# Altium footprint library NXP_60_26022015.PCBLIB: 287 footprints (part 3 of 18)
Each footprint in its own frame and in the unit in brackets; x right, y up, seen from the top. Pads: shape width x height; smd on the part's side, far side on the other; paste and mask are expansions set on the pad; w line width, h text height; cw(c..) or ccw(c..) is an arc to the next point about the centre after c.
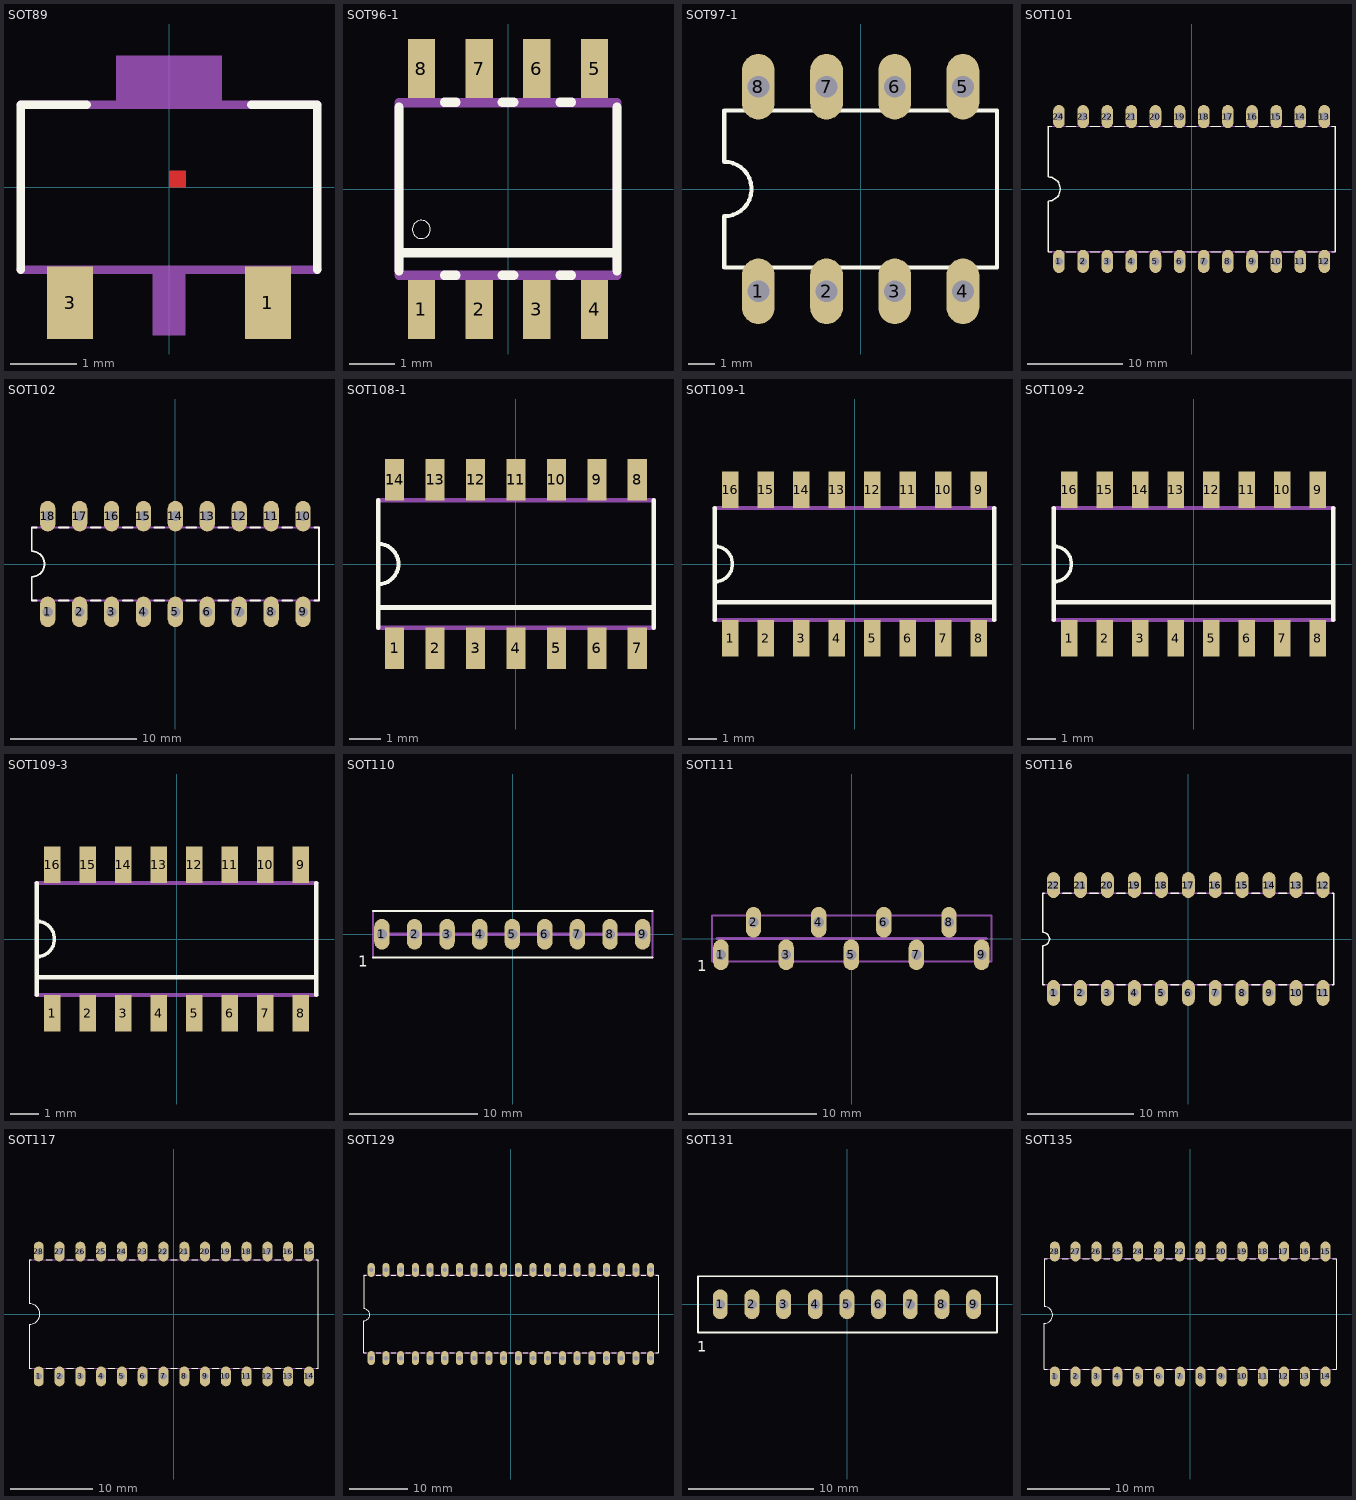
[diagram p2: the footprints below, top view; thin cyan lines are the x and y axes]

## SOT89 [mm]
pads (3):
  rect 0.7x1.1 smd: 1(1.5,-1.75) 3(-1.5,-1.75)
  rect 0x0 smd: 2(0,-2)
Top Layer:
  region: 0,0 0.254,0 0.254,0.254 0,0.254
Top Overlay:
  lines w0.127: -2.25,-1.25 -2.25,1.25 -1.25,1.25 ; 1.25,1.25 2.25,1.25 2.25,-1.25
Top Paste:
  rectangle: -0.3,-2.25 0.3,-1.25
  rectangle: -1.8,-2.25 -1.2,-1.25
  rectangle: 1.2,-2.25 1.8,-1.25
  rectangle: -0.95,1.4 0.95,2.25
  rectangle: -0.6,0 0.6,1.2
Top Solder:
  region: 0,0 0.254,0 0.254,0.254 0,0.254
Mechanical 16:
  rectangle: -0.25,-2.25 0.25,-1.25
  rectangle: -1.75,-2.25 -1.25,-1.25
  rectangle: 1.25,-2.25 1.75,-1.25
  rectangle: -0.8,1.25 0.8,2
  lines w0.127: -2.25,-1.25 2.25,-1.25 ; -2.25,1.25 2.25,1.25

## SOT96-1 [mm]
pads (8):
  rect 0.6x1.3 smd: 1(-1.905,-2.65) 2(-0.635,-2.65) 3(0.635,-2.65) 4(1.905,-2.65) 5(1.905,2.65) 6(0.635,2.65) 7(-0.635,2.65) 8(-1.905,2.65)
Top Overlay:
  circle w0: c-1.905,-0.889 r0.2
  lines w0.203: -2.4,-1.8 -2.4,-1.4 ; -2.4,1.8 -2.4,-1.4 ; -1.397,-1.9 -1.143,-1.9 ; -1.397,1.91 -1.143,1.91 ; -0.127,-1.9 0.127,-1.9 ; -0.127,1.91 0.127,1.91 ; 1.143,-1.9 1.397,-1.9 ; 1.143,1.91 1.397,1.91 ; 2.4,-1.8 2.4,-1.4 ; 2.4,1.8 2.4,-1.4 ; -2.4,-1.4 2.4,-1.4
Mechanical 16:
  rectangle: -2.15,-3.1 -1.66,-2
  rectangle: -0.88,-3.1 -0.39,-2
  rectangle: 0.39,-3.1 0.88,-2
  rectangle: 1.66,-3.1 2.15,-2
  rectangle: 1.66,2 2.15,3.1
  rectangle: 0.39,2 0.88,3.1
  rectangle: -0.88,2 -0.39,3.1
  rectangle: -2.15,2 -1.66,3.1
  lines w0.203: -2.4,-1.9 2.4,-1.9 2.4,-1.4 2.4,1.9 -2.4,1.9 -2.4,-1.4 -2.4,-1.9

## SOT97-1 [mil]
pads (8):
  oval 48x96 hole 32: 1(-150,-150) 2(-50,-150) 3(50,-150) 4(150,-150) 5(150,150) 6(50,150) 7(-50,150) 8(-150,150)
Top Overlay:
  lines w6: -200,-115 200,-115 200,115 -200,115 -200,40 cw(c-200,0) -200,-40 -200,-115

## SOT101 [mil]
pads (24):
  oval 48x96 hole 32: 1(-550,-300) 2(-450,-300) 3(-350,-300) 4(-250,-300) 5(-150,-300) 6(-50,-300) 7(50,-300) 8(150,-300) 9(250,-300) 10(350,-300) 11(450,-300) 12(550,-300) 13(550,300) 14(450,300) 15(350,300) 16(250,300) 17(150,300) 18(50,300) 19(-50,300) 20(-150,300) 21(-250,300) 22(-350,300) 23(-450,300) 24(-550,300)
Top Overlay:
  lines w5: -595,-260 -580,-260 ; -595,260 -580,260 ; -520,-260 -480,-260 ; -520,260 -480,260 ; -420,-260 -380,-260 ; -420,260 -380,260 ; -320,-260 -280,-260 ; -320,260 -280,260 ; -220,-260 -180,-260 ; -220,260 -180,260 ; -120,-260 -80,-260 ; -120,260 -80,260 ; -20,-260 20,-260 ; -20,260 20,260 ; 80,-260 120,-260 ; 80,260 120,260 ; 180,-260 220,-260 ; 180,260 220,260 ; 280,-260 320,-260 ; 280,260 320,260 ; 380,-260 420,-260 ; 380,260 420,260 ; 480,-260 520,-260 ; 480,260 520,260 ; 580,-260 595,-260 ; 580,260 595,260
  lines w6: -595,-260 -595,-50 ccw(c-595,0) -595,50 -595,260 ; 595,-260 595,260
Mechanical 16:
  lines w5: -595,260 595,260
  lines w6: -595,-260 595,-260

## SOT102 [mil]
pads (18):
  oval 48x96 hole 32: 1(-400,-150) 2(-300,-150) 3(-200,-150) 4(-100,-150) 5(0,-150) 6(100,-150) 7(200,-150) 8(300,-150) 9(400,-150) 10(400,150) 11(300,150) 12(200,150) 13(100,150) 14(0,150) 15(-100,150) 16(-200,150) 17(-300,150) 18(-400,150)
Top Overlay:
  lines w6: -435,-115 -450,-115 -450,-40 ccw(c-450,0) -450,40 -450,115 -435,115 ; -365,-115 -335,-115 ; -365,115 -335,115 ; -265,-115 -235,-115 ; -265,115 -235,115 ; -165,-115 -135,-115 ; -165,115 -135,115 ; -65,-115 -35,-115 ; -65,115 -35,115 ; 35,-115 65,-115 ; 35,115 65,115 ; 135,-115 165,-115 ; 135,115 165,115 ; 235,-115 265,-115 ; 235,115 265,115 ; 335,-115 365,-115 ; 335,115 365,115 ; 435,-115 450,-115 450,115 435,115
Mechanical 16:
  lines w6: -450,-115 450,-115 ; -450,115 450,115

## SOT108-1 [mm]
pads (14):
  rect 0.6x1.3 smd: 1(-3.81,-2.65) 2(-2.54,-2.65) 3(-1.27,-2.65) 4(0,-2.65) 5(1.27,-2.65) 6(2.54,-2.65) 7(3.81,-2.65) 8(3.81,2.65) 9(2.54,2.65) 10(1.27,2.65) 11(0,2.65) 12(-1.27,2.65) 13(-2.54,2.65) 14(-3.81,2.65)
Top Overlay:
  lines w0.127: -4.325,-0.635 ccw(c-4.325,0) -4.325,0.635
  lines w0.152: -4.325,-2 -4.325,-1.37 ; -4.325,2 -4.325,0.635 -4.325,-0.635 -4.325,-1.37 ; 4.325,-2 4.325,-1.37 ; 4.325,2 4.325,-1.37 ; -4.325,-1.37 4.325,-1.37
Mechanical 16:
  rectangle: -0.254,2 0.254,3
  rectangle: -1.524,2 -1.016,3
  rectangle: -2.794,2 -2.286,3
  rectangle: -4.064,2 -3.556,3
  rectangle: 1.016,2 1.524,3
  rectangle: 2.286,2 2.794,3
  rectangle: 3.556,2 4.064,3
  rectangle: -0.254,-3 0.254,-2
  rectangle: -1.524,-3 -1.016,-2
  rectangle: -2.794,-3 -2.286,-2
  rectangle: -4.064,-3 -3.556,-2
  rectangle: 1.016,-3 1.524,-2
  rectangle: 2.286,-3 2.794,-2
  rectangle: 3.556,-3 4.064,-2
  lines w0.152: -4.325,-2 4.325,-2 ; -4.325,2 4.325,2

## SOT109-1 [mm]
pads (16):
  rect 0.6x1.3 smd: 1(-4.445,-2.65) 2(-3.175,-2.65) 3(-1.905,-2.65) 4(-0.635,-2.65) 5(0.635,-2.65) 6(1.905,-2.65) 7(3.175,-2.65) 8(4.445,-2.65) 9(4.445,2.65) 10(3.175,2.65) 11(1.905,2.65) 12(0.635,2.65) 13(-0.635,2.65) 14(-1.905,2.65) 15(-3.175,2.65) 16(-4.445,2.65)
Top Overlay:
  lines w0.127: -5,-0.635 ccw(c-5,0) -5,0.635
  lines w0.152: -5,-2 -5,-1.37 ; -5,2 -5,0.635 -5,-0.635 -5,-1.37 ; 5,-2 5,-1.37 ; 5,2 5,-1.37 ; -5,-1.37 5,-1.37
Mechanical 16:
  rectangle: -0.889,2 -0.381,3
  rectangle: -2.159,2 -1.651,3
  rectangle: -3.429,2 -2.921,3
  rectangle: -4.699,2 -4.191,3
  rectangle: 0.381,2 0.889,3
  rectangle: 1.651,2 2.159,3
  rectangle: 2.921,2 3.429,3
  rectangle: 4.191,2 4.699,3
  rectangle: -0.889,-3 -0.381,-2
  rectangle: -2.159,-3 -1.651,-2
  rectangle: -3.429,-3 -2.921,-2
  rectangle: -4.699,-3 -4.191,-2
  rectangle: 0.381,-3 0.889,-2
  rectangle: 1.651,-3 2.159,-2
  rectangle: 2.921,-3 3.429,-2
  rectangle: 4.191,-3 4.699,-2
  lines w0.152: -5,-2 5,-2 ; -5,2 5,2

## SOT109-2 [mm]
pads (16):
  rect 0.6x1.3 smd: 1(-4.445,-2.65) 2(-3.175,-2.65) 3(-1.905,-2.65) 4(-0.635,-2.65) 5(0.635,-2.65) 6(1.905,-2.65) 7(3.175,-2.65) 8(4.445,-2.65) 9(4.445,2.65) 10(3.175,2.65) 11(1.905,2.65) 12(0.635,2.65) 13(-0.635,2.65) 14(-1.905,2.65) 15(-3.175,2.65) 16(-4.445,2.65)
Top Overlay:
  lines w0.127: -5,-0.635 ccw(c-5,0) -5,0.635
  lines w0.152: -5,-2 -5,-1.37 ; -5,2 -5,0.635 -5,-0.635 -5,-1.37 ; 5,-2 5,-1.37 ; 5,2 5,-1.37 ; -5,-1.37 5,-1.37
Mechanical 16:
  rectangle: -0.889,2 -0.381,3
  rectangle: -2.159,2 -1.651,3
  rectangle: -3.429,2 -2.921,3
  rectangle: -4.699,2 -4.191,3
  rectangle: 0.381,2 0.889,3
  rectangle: 1.651,2 2.159,3
  rectangle: 2.921,2 3.429,3
  rectangle: 4.191,2 4.699,3
  rectangle: -0.889,-3 -0.381,-2
  rectangle: -2.159,-3 -1.651,-2
  rectangle: -3.429,-3 -2.921,-2
  rectangle: -4.699,-3 -4.191,-2
  rectangle: 0.381,-3 0.889,-2
  rectangle: 1.651,-3 2.159,-2
  rectangle: 2.921,-3 3.429,-2
  rectangle: 4.191,-3 4.699,-2
  lines w0.152: -5,-2 5,-2 ; -5,2 5,2

## SOT109-3 [mm]
pads (16):
  rect 0.6x1.3 smd: 1(-4.445,-2.65) 2(-3.175,-2.65) 3(-1.905,-2.65) 4(-0.635,-2.65) 5(0.635,-2.65) 6(1.905,-2.65) 7(3.175,-2.65) 8(4.445,-2.65) 9(4.445,2.65) 10(3.175,2.65) 11(1.905,2.65) 12(0.635,2.65) 13(-0.635,2.65) 14(-1.905,2.65) 15(-3.175,2.65) 16(-4.445,2.65)
Top Overlay:
  lines w0.127: -5,-0.635 ccw(c-5,0) -5,0.635
  lines w0.152: -5,-2 -5,-1.37 ; -5,2 -5,0.635 -5,-0.635 -5,-1.37 ; 5,-2 5,-1.37 ; 5,2 5,-1.37 ; -5,-1.37 5,-1.37
Mechanical 16:
  rectangle: -0.889,2 -0.381,3
  rectangle: -2.159,2 -1.651,3
  rectangle: -3.429,2 -2.921,3
  rectangle: -4.699,2 -4.191,3
  rectangle: 0.381,2 0.889,3
  rectangle: 1.651,2 2.159,3
  rectangle: 2.921,2 3.429,3
  rectangle: 4.191,2 4.699,3
  rectangle: -0.889,-3 -0.381,-2
  rectangle: -2.159,-3 -1.651,-2
  rectangle: -3.429,-3 -2.921,-2
  rectangle: -4.699,-3 -4.191,-2
  rectangle: 0.381,-3 0.889,-2
  rectangle: 1.651,-3 2.159,-2
  rectangle: 2.921,-3 3.429,-2
  rectangle: 4.191,-3 4.699,-2
  lines w0.152: -5,-2 5,-2 ; -5,2 5,2

## SOT110 [mil]
pads (9):
  oval 47.25x94.5 hole 31.5: 1(-401.57,0) 2(-301.57,0) 3(-201.57,0) 4(-101.57,0) 5(-1.57,0) 6(98.43,0) 7(198.43,0) 8(298.43,0) 9(398.43,0)
Top Overlay:
  lines w6: -429.13,-70.87 429.13,-70.87 ; -429.13,70.87 429.13,70.87
  text "1" at -475,-100 h33.46
Mechanical 16:
  lines w6: -429.13,-70.87 -429.13,70.87 ; 429.13,-70.87 429.13,70.87
  lines w10: -413.39,0 413.39,0

## SOT111 [mil]
pads (9):
  oval 47.25x94.5 hole 31.5: 1(-401.57,-50) 2(-301.57,50) 3(-201.57,-50) 4(-101.57,50) 5(-1.57,-50) 6(98.43,50) 7(198.43,-50) 8(298.43,50) 9(398.43,-50)
Top Overlay:
  text "1" at -475,-100 h33.46
Mechanical 16:
  lines w6: -429.13,-70.87 429.13,-70.87 429.13,70.87 -429.13,70.87 -429.13,-70.87
  lines w10: -413.39,0 413.39,0

## SOT116 [mil]
pads (22):
  oval 48x96 hole 32: 1(-500,-200) 2(-400,-200) 3(-300,-200) 4(-200,-200) 5(-100,-200) 6(0,-200) 7(100,-200) 8(200,-200) 9(300,-200) 10(400,-200) 11(500,-200) 12(500,200) 13(400,200) 14(300,200) 15(200,200) 16(100,200) 17(0,200) 18(-100,200) 19(-200,200) 20(-300,200) 21(-400,200) 22(-500,200)
Top Overlay:
  lines w6: -535,-170 -540,-170 -540,-25 ccw(c-540,0) -540,25 -540,170 -535,170 ; -465,-170 -435,-170 ; -465,170 -435,170 ; -365,-170 -335,-170 ; -365,170 -335,170 ; -265,-170 -235,-170 ; -265,170 -235,170 ; -165,-170 -135,-170 ; -165,170 -135,170 ; -65,-170 -35,-170 ; -65,170 -35,170 ; 35,-170 65,-170 ; 35,170 65,170 ; 135,-170 140,-170 165,-170 ; 135,170 140,170 165,170 ; 235,-170 240,-170 265,-170 ; 235,170 240,170 265,170 ; 335,-170 365,-170 ; 335,170 365,170 ; 435,-170 465,-170 ; 435,170 465,170 ; 535,-170 540,-170 540,170 535,170
Mechanical 16:
  lines w6: -540,-170 540,-170 ; -540,170 540,170

## SOT117 [mil]
pads (28):
  oval 48x96 hole 32: 1(-650,-300) 2(-550,-300) 3(-450,-300) 4(-350,-300) 5(-250,-300) 6(-150,-300) 7(-50,-300) 8(50,-300) 9(150,-300) 10(250,-300) 11(350,-300) 12(450,-300) 13(550,-300) 14(650,-300) 15(650,300) 16(550,300) 17(450,300) 18(350,300) 19(250,300) 20(150,300) 21(50,300) 22(-50,300) 23(-150,300) 24(-250,300) 25(-350,300) 26(-450,300) 27(-550,300) 28(-650,300)
Top Overlay:
  lines w6: -685,-260 -695,-260 -695,-50 ccw(c-695,0) -695,50 -695,260 -685,260 ; -615,-260 -585,-260 ; -615,260 -585,260 ; -515,-260 -485,-260 ; -515,260 -485,260 ; -415,-260 -385,-260 ; -415,260 -385,260 ; -315,-260 -285,-260 ; -315,260 -285,260 ; -215,-260 -185,-260 ; -215,260 -185,260 ; -115,-260 -85,-260 ; -115,260 -85,260 ; -15,-260 -10,-260 15,-260 ; -15,260 -10,260 15,260 ; 85,-260 90,-260 115,-260 ; 85,260 90,260 115,260 ; 185,-260 215,-260 ; 185,260 215,260 ; 285,-260 315,-260 ; 285,260 315,260 ; 385,-260 415,-260 ; 385,260 415,260 ; 485,-260 515,-260 ; 485,260 515,260 ; 585,-260 615,-260 ; 585,260 615,260 ; 685,-260 695,-260 695,260 685,260
Mechanical 16:
  lines w6: -695,-260 695,-260 ; -695,260 695,260

## SOT129 [mil]
pads (40):
  oval 48x96 hole 32: 1(-950,-300) 2(-850,-300) 3(-750,-300) 4(-650,-300) 5(-550,-300) 6(-450,-300) 7(-350,-300) 8(-250,-300) 9(-150,-300) 10(-50,-300) 11(50,-300) 12(150,-300) 13(250,-300) 14(350,-300) 15(450,-300) 16(550,-300) 17(650,-300) 18(750,-300) 19(850,-300) 20(950,-300) 21(950,300) 22(850,300) 23(750,300) 24(650,300) 25(550,300) 26(450,300) 27(350,300) 28(250,300) 29(150,300) 30(50,300) 31(-50,300) 32(-150,300) 33(-250,300) 34(-350,300) 35(-450,300) 36(-550,300) 37(-650,300) 38(-750,300) 39(-850,300) 40(-950,300)
Top Overlay:
  lines w6: -985,-265 -1000,-265 -1000,-45 ccw(c-1000,-5) -1000,35 -1000,265 -985,265 ; -915,-265 -885,-265 ; -915,265 -885,265 ; -815,-265 -785,-265 ; -815,265 -785,265 ; -715,-265 -685,-265 ; -715,265 -685,265 ; -615,-265 -585,-265 ; -615,265 -585,265 ; -515,-265 -485,-265 ; -515,265 -485,265 ; -415,-265 -385,-265 ; -415,265 -385,265 ; -315,-265 -310,-265 -285,-265 ; -315,265 -310,265 -285,265 ; -215,-265 -210,-265 -185,-265 ; -215,265 -210,265 -185,265 ; -115,-265 -85,-265 ; -115,265 -85,265 ; -15,-265 15,-265 ; -15,265 15,265 ; 85,-265 115,-265 ; 85,265 115,265 ; 185,-265 215,-265 ; 185,265 215,265 ; 285,-265 315,-265 ; 285,265 315,265 ; 385,-265 415,-265 ; 385,265 415,265 ; 485,-265 515,-265 ; 485,265 515,265 ; 585,-265 615,-265 ; 585,265 615,265 ; 685,-265 715,-265 ; 685,265 715,265 ; 785,-265 815,-265 ; 785,265 815,265 ; 885,-265 915,-265 ; 885,265 915,265 ; 985,-265 1000,-265 1000,265 985,265
Mechanical 16:
  lines w6: -1000,-265 1000,-265 ; -1000,265 1000,265

## SOT131 [mil]
pads (9):
  oval 47.25x94.5 hole 31.5: 1(-401.57,0) 2(-301.57,0) 3(-201.57,0) 4(-101.57,0) 5(-1.57,0) 6(98.43,0) 7(198.43,0) 8(298.43,0) 9(398.43,0)
Top Overlay:
  lines w6: -472.44,-88.58 472.44,-88.58 472.44,88.58 -472.44,88.58 -472.44,-88.58
  text "1" at -475,-150 h33.46

## SOT135 [mil]
pads (28):
  oval 48x96 hole 32: 1(-650,-300) 2(-550,-300) 3(-450,-300) 4(-350,-300) 5(-250,-300) 6(-150,-300) 7(-50,-300) 8(50,-300) 9(150,-300) 10(250,-300) 11(350,-300) 12(450,-300) 13(550,-300) 14(650,-300) 15(650,300) 16(550,300) 17(450,300) 18(350,300) 19(250,300) 20(150,300) 21(50,300) 22(-50,300) 23(-150,300) 24(-250,300) 25(-350,300) 26(-450,300) 27(-550,300) 28(-650,300)
Top Overlay:
  lines w6: -685,-265 -700,-265 -700,-45 ccw(c-700,-5) -700,35 -700,265 -685,265 ; -615,-265 -585,-265 ; -615,265 -585,265 ; -515,-265 -485,-265 ; -515,265 -485,265 ; -415,-265 -385,-265 ; -415,265 -385,265 ; -315,-265 -285,-265 ; -315,265 -285,265 ; -215,-265 -185,-265 ; -215,265 -185,265 ; -115,-265 -85,-265 ; -115,265 -85,265 ; -15,-265 -10,-265 15,-265 ; -15,265 -10,265 15,265 ; 85,-265 90,-265 115,-265 ; 85,265 90,265 115,265 ; 185,-265 215,-265 ; 185,265 215,265 ; 285,-265 315,-265 ; 285,265 315,265 ; 385,-265 415,-265 ; 385,265 415,265 ; 485,-265 515,-265 ; 485,265 515,265 ; 585,-265 615,-265 ; 585,265 615,265 ; 685,-265 700,-265 700,265 685,265
Mechanical 16:
  lines w6: -700,-265 700,-265 ; -700,265 700,265